# Altium footprint library PCB贴片元件封装库.pcblib: 366 footprints (part 14 of 23)
Each footprint in its own frame and in the unit in brackets; x right, y up, seen from the top. Pads: shape width x height; smd on the part's side, far side on the other; paste and mask are expansions set on the pad; w line width, h text height; cw(c..) or ccw(c..) is an arc to the next point about the centre after c.
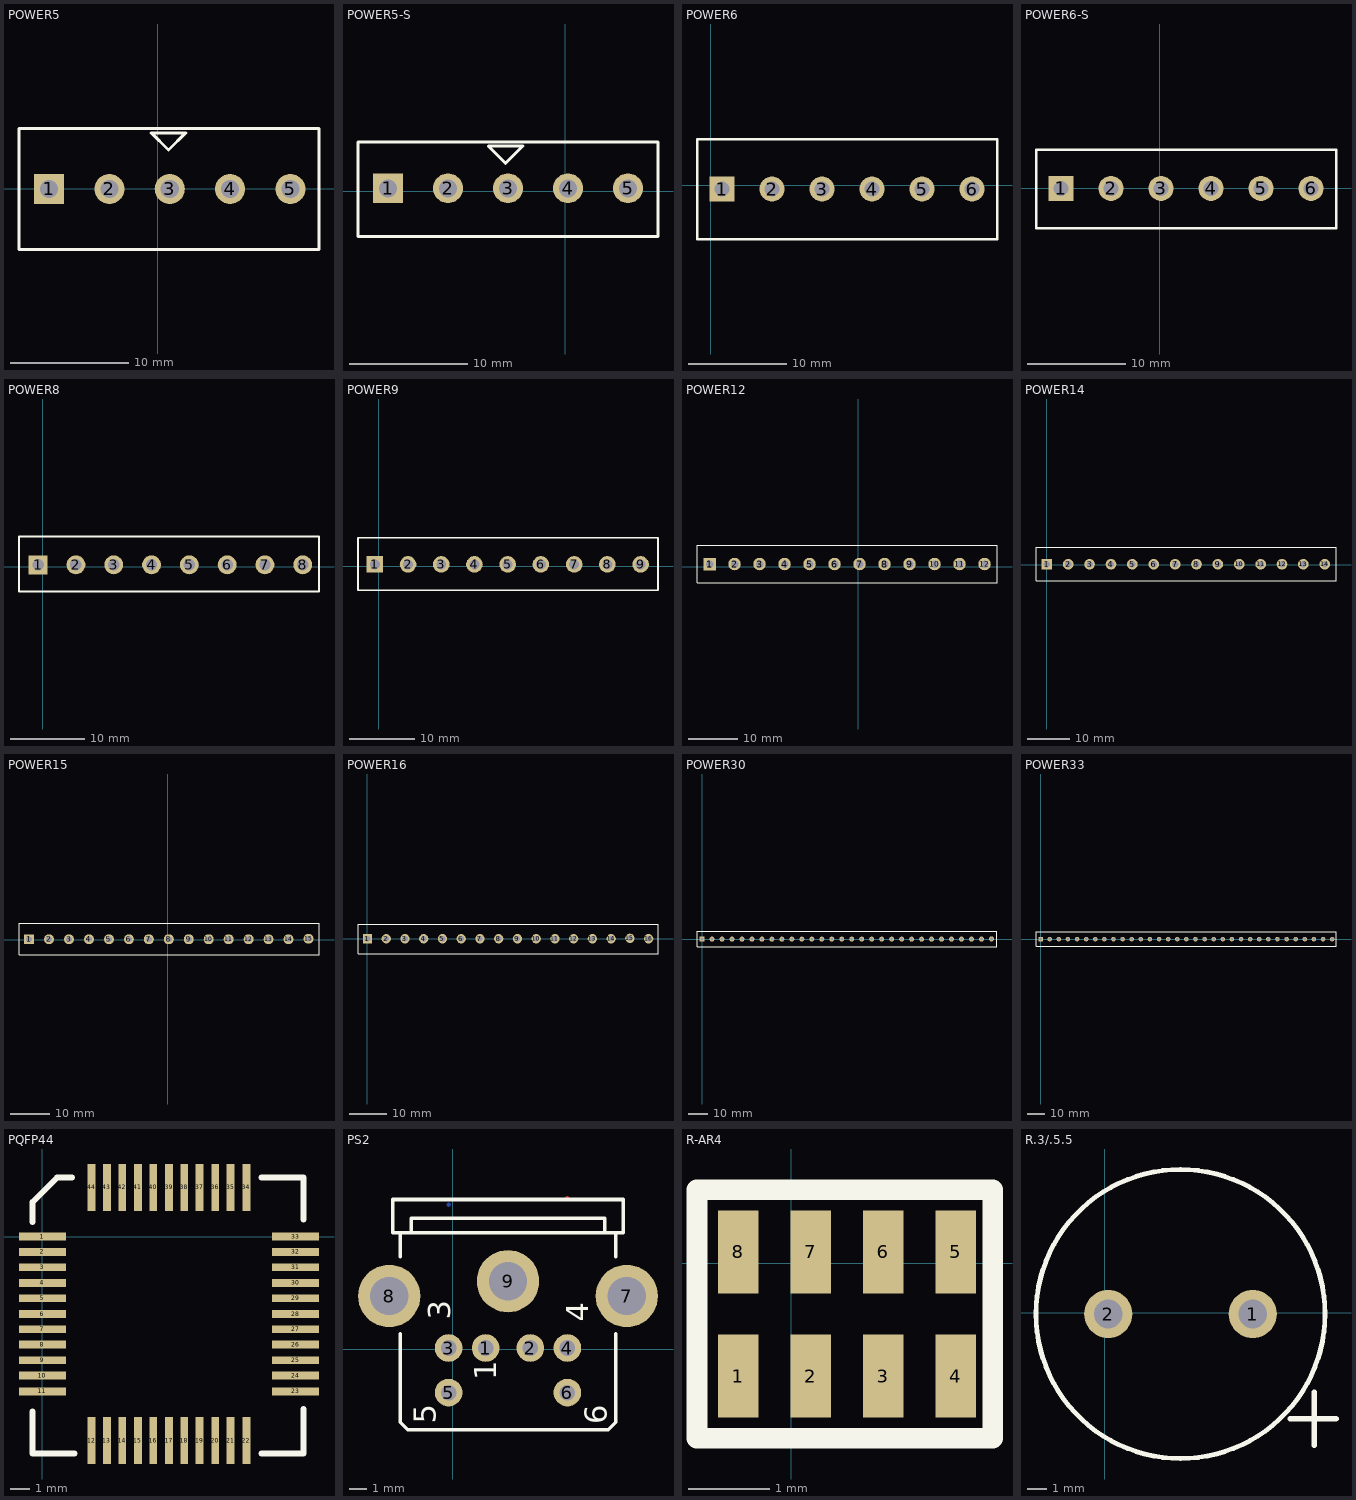
[diagram p13: the footprints below, top view; thin cyan lines are the x and y axes]

## POWER5 [mil]
pads (5):
  rect 100x100 hole 60: 1(-360,0)
  round 100 hole 60: 2(-160,0) 3(40,0) 4(240,0) 5(440,0)
TopOverlay:
  lines w10: -460,-200 535,-200 535,200 -460,200 -460,-200 ; -21.5,186.5 93.5,186.5 36,129 -21.5,186.5

## POWER5-S [mil]
pads (5):
  rect 100x100 hole 60: 1(-590,10)
  round 100 hole 60: 2(-390,10) 3(-190,10) 4(10,10) 5(210,10)
TopOverlay:
  lines w10: -690,-150 -690,165 310,165 310,-150 -690,-150 ; -255.5,150.5 -198,93 -140.5,150.5 -255.5,150.5

## POWER6 [mil]
pads (6):
  rect 100x100 hole 60: 1(45,-15)
  round 100 hole 60: 2(245,-15) 3(445,-15) 4(645,-15) 5(845,-15) 6(1045,-15)
TopOverlay:
  lines w10: -55,-215 1145,-215 1145,185 -55,185 -55,-215

## POWER6-S [mil]
pads (6):
  rect 100x100 hole 60: 1(-395,0)
  round 100 hole 60: 2(-195,0) 3(5,0) 4(205,0) 5(405,0) 6(605,0)
TopOverlay:
  lines w10: -495,-160 -495,155 705,155 705,-160 -495,-160

## POWER8 [mil]
pads (8):
  rect 100x100 hole 60: 1(-25,10)
  round 100 hole 60: 2(175,10) 3(375,10) 4(575,10) 5(775,10) 6(975,10) 7(1175,10) 8(1375,10)
TopOverlay:
  lines w10: -126.1,-130 1461,-130 1461,159 -126.1,159 -126.1,-130

## POWER9 [mil]
pads (9):
  rect 100x100 hole 60: 1(-25,10)
  round 100 hole 60: 2(175,10) 3(375,10) 4(575,10) 5(775,10) 6(975,10) 7(1175,10) 8(1375,10) 9(1575,10)
TopOverlay:
  lines w10: -126.1,-145 -126.1,170 1680,170 1680,-145 -126.1,-145

## POWER12 [mil]
pads (12):
  rect 100x100 hole 60: 1(-1191.1,22.8)
  round 100 hole 60: 2(-991.1,22.8) 3(-791.1,22.8) 4(-591.1,22.8) 5(-391.1,22.8) 6(-191.1,22.8) 7(8.9,22.8) 8(208.9,22.8) 9(408.9,22.8) 10(608.9,22.8) 11(808.9,22.8) 12(1008.9,22.8)
TopOverlay:
  lines w10: -1291.1,-127.2 -1291.1,172.8 1108.9,172.8 1108.9,-127.2 -1291.1,-127.2

## POWER14 [mil]
pads (14):
  rect 100x100 hole 60: 1(0,5)
  round 100 hole 60: 2(200,5) 3(400,5) 4(600,5) 5(800,5) 6(1000,5) 7(1200,5) 8(1400,5) 9(1600,5) 10(1800,5) 11(2000,5) 12(2200,5) 13(2400,5) 14(2600,5)
TopOverlay:
  lines w10: -101.1,-150 -101.1,165 2705,165 2705,-150 -101.1,-150

## POWER15 [mil]
pads (15):
  rect 100x100 hole 60: 1(-1390,5)
  round 100 hole 60: 2(-1190,5) 3(-990,5) 4(-790,5) 5(-590,5) 6(-390,5) 7(-190,5) 8(10,5) 9(210,5) 10(410,5) 11(610,5) 12(810,5) 13(1010,5) 14(1210,5) 15(1410,10)
TopOverlay:
  lines w10: -1491.1,-150 -1491.1,165 1515,165 1515,-150 -1491.1,-150

## POWER16 [mil]
pads (16):
  rect 100x100 hole 60: 1(0,0)
  round 100 hole 60: 2(200,0) 3(400,0) 4(600,0) 5(800,0) 6(1000,0) 7(1200,0) 8(1400,0) 9(1600,0) 10(1800,0) 11(2000,0) 12(2200,0) 13(2400,0) 14(2600,0) 15(2800,5) 16(3000,0)
TopOverlay:
  lines w10: -101.1,-160 3100,-160 3100,155 -101.1,155 -101.1,-160

## POWER30 [mil]
pads (30):
  rect 100x100 hole 60: 1(0,0)
  round 100 hole 60: 2(200,0) 3(400,0) 4(600,0) 5(800,0) 6(1000,0) 7(1200,0) 8(1400,0) 9(1600,0) 10(1800,0) 11(2000,0) 12(2200,0) 13(2400,0) 14(2600,0) 15(2800,0) 16(3000,0) 17(3200,0) 18(3400,0) 19(3600,0) 20(3800,0) 21(4000,0) 22(4200,0) 23(4400,0) 24(4600,0) 25(4800,0) 26(5000,0) 27(5200,0) 28(5400,0) 29(5600,0) 30(5800,5)
TopOverlay:
  lines w10: 2898.9,-155 5905,-155 5905,160 ; 2905,-155 -101.1,-155 -101.1,160 2905,160 5911.1,160

## POWER33 [mil]
pads (33):
  rect 100x100 hole 60: 1(0,0)
  round 100 hole 60: 2(200,0) 3(400,0) 4(600,0) 5(800,0) 6(1000,0) 7(1200,0) 8(1400,0) 9(1600,0) 10(1800,0) 11(2000,0) 12(2200,0) 13(2400,0) 14(2600,0) 15(2800,0) 16(3000,0) 17(3200,0) 18(3400,0) 19(3600,0) 20(3800,0) 21(4000,0) 22(4200,0) 23(4400,0) 24(4600,0) 25(4800,0) 26(5000,0) 27(5200,0) 28(5400,0) 29(5600,0) 30(5800,0) 31(6000,0) 32(6200,0) 33(6400,0)
TopOverlay:
  lines w10: 2898.9,-155 6485,-155 6485,160 2905,160 -101.1,160 -101.1,-155 2905,-155

## PQFP44 [mil]
pads (44):
  rect 95x16 smd: 1(0,0) 2(0,-31) 3(0,-62) 4(0,-94) 5(0,-125) 6(0,-157) 7(0,-188) 8(0,-219) 9(0,-251) 10(0,-282) 11(0,-314) 23(514,-314) 24(514,-282) 25(514,-251) 26(514,-219) 27(514,-188) 28(514,-157) 29(514,-125) 30(514,-94) 31(514,-62) 32(514,-31) 33(514,0)
  rect 16x95 smd: 12(100,-414) 13(131,-414) 14(162,-414) 15(194,-414) 16(225,-414) 17(257,-414) 18(288,-414) 19(319,-414) 20(351,-414) 21(382,-414) 22(414,-414) 34(414,100) 35(382,100) 36(351,100) 37(319,100) 38(288,100) 39(257,100) 40(225,100) 41(194,100) 42(162,100) 43(131,100) 44(100,100)
TopOverlay:
  lines w12: -20,-355 -20,-440 65,-440 ; -20,30 -20,70 30,120 60,120 ; 445,-440 530,-440 530,-350 ; 445,120 530,120 530,35

## PS2 [mil]
pads (9):
  round 62 hole 35: 1(74,3) 2(174,3) 3(-9.33,3) 4(257.33,3) 5(-9.33,-97) 6(257.33,-97)
  round 140 hole 86: 7(390.67,119.67) 8(-142.67,119.67) 9(124,153)
TopLayer:
  lines w10: 257,339 257.33,338.67
BottomLayer:
  lines w10: -9.33,324.67 -9,325 ; 256.33,-98 257.33,-97
TopOverlay:
  lines w8: -117.67,34.5 -117.67,-163.67 -101,-180.33 349,-180.33 365.67,-163.67 365.67,34.5 ; -117.67,207.72 -117.67,261.33 ; 365.67,207.72 365.67,261.33 ; -92.67,261.33 340.67,261.33 ; -92.67,261.33 -134.33,261.33 -134.33,336.33 382.33,336.33 382.33,261.33 340.67,261.33 ; -92.67,261.33 -92.67,294.67 340.67,294.67 340.67,261.33
  text "1" at 97.43,-69.1 h50
  text "3" at -5.23,66.9 h50
  text "4" at 304.1,61.57 h50
  text "6" at 345.43,-167.76 h50
  text "5" at -38.57,-166.43 h50

## R-AR4 [mil]
pads (8):
  rect 19.68x40 smd: 1(-25.48,-54.57) 2(9.52,-54.57) 3(44.52,-54.57) 4(79.52,-54.57) 5(79.52,5.43) 6(44.52,5.43) 7(9.52,5.43) 8(-25.48,5.43)
TopOverlay:
  lines w10: 95.52,-84.57 -45.48,-84.57 -45.48,35.43 97.52,35.43 97.52,-84.57

## R.3/.5.5 [mil]
pads (2):
  round 100 hole 60: 1(307.17,-2.36) 2(7.17,-2.36)
TopOverlay:
  circle w10: c157.17,-2.36 r300
  lines w12: 385,-220 480,-220 ; 435,-275 435,-165